# Altium footprint library CONN_B2B.PcbLib: 30 footprints (part 2 of 2)
Each footprint in its own frame and in the unit in brackets; x right, y up, seen from the top. Pads: shape width x height; smd on the part's side, far side on the other; paste and mask are expansions set on the pad; w line width, h text height; cw(c..) or ccw(c..) is an arc to the next point about the centre after c.
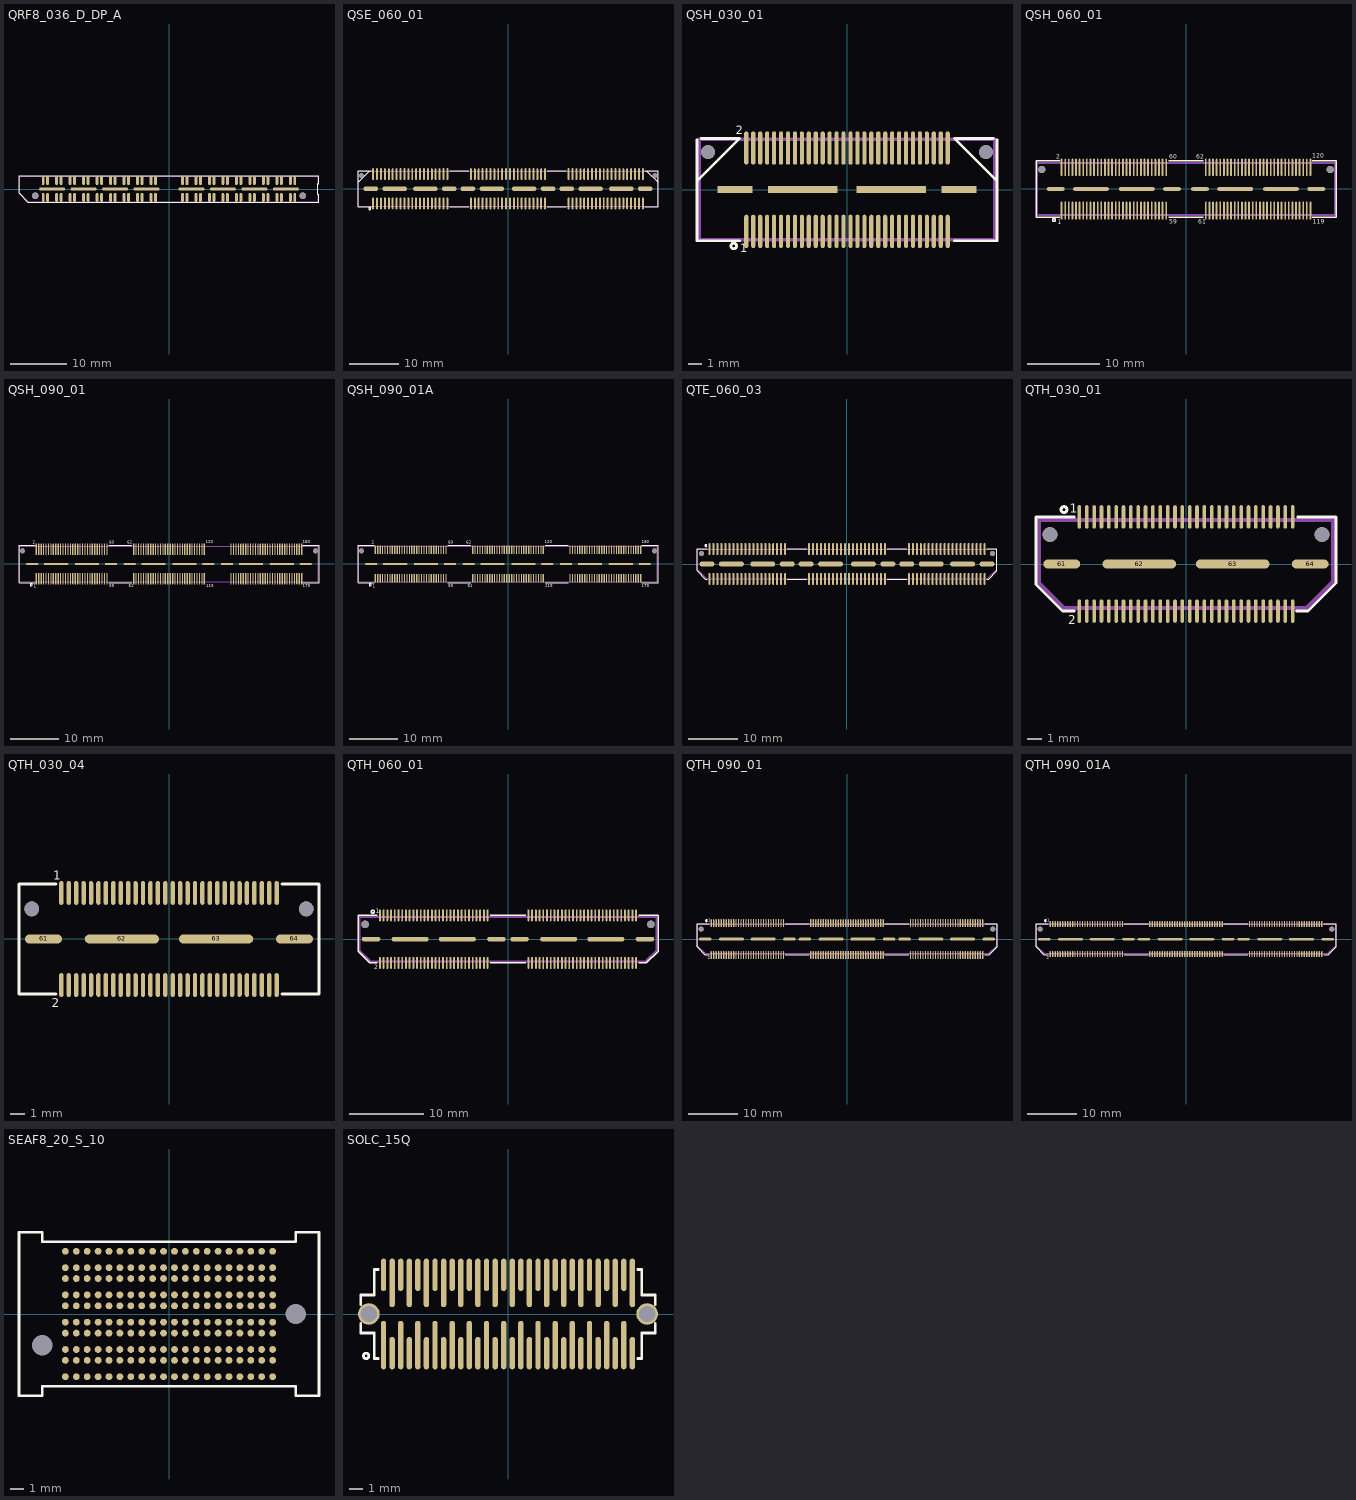
[diagram p1: the footprints below, top view; thin cyan lines are the x and y axes]

## QRF8_036_D_DP_A [mm] "Samtec, QRF8-036-D-DP-A, 0.80 mm Q Rate® High-Speed Ground Plane Slim Body Socket Strip, Differential Pair"
pads (82):
  oval 0.5x1.6 smd mask+0.05: 1(-22.4,-1.5) 2(-22.4,1.5) 3(-21.6,-1.5) 4(-21.6,1.5) 5(-20,-1.5) 6(-20,1.5) 7(-19.2,-1.5) 8(-19.2,1.5) 9(-17.6,-1.5) 10(-17.6,1.5) 11(-16.8,-1.5) 12(-16.8,1.5) 13(-15.2,-1.5) 14(-15.2,1.5) 15(-14.4,-1.5) 16(-14.4,1.5) 17(-12.8,-1.5) 18(-12.8,1.5) 19(-12,-1.5) 20(-12,1.5) 21(-10.4,-1.5) 22(-10.4,1.5) 23(-9.6,-1.5) 24(-9.6,1.5) 25(-8,-1.5) 26(-8,1.5) 27(-7.2,-1.5) 28(-7.2,1.5) 29(-5.6,-1.5) 30(-5.6,1.5) 31(-4.8,-1.5) 32(-4.8,1.5) 33(-3.2,-1.5) 34(-3.2,1.5) 35(-2.4,-1.5) 36(-2.4,1.5) 37(2.4,-1.5) 38(2.4,1.5) 39(3.2,-1.5) 40(3.2,1.5) 41(4.8,-1.5) 42(4.8,1.5) 43(5.6,-1.5) 44(5.6,1.5) 45(7.2,-1.5) 46(7.2,1.5) 47(8,-1.5) 48(8,1.5) 49(9.6,-1.5) 50(9.6,1.5) 51(10.4,-1.5) 52(10.4,1.5) 53(12,-1.5) 54(12,1.5) 55(12.8,-1.5) 56(12.8,1.5) 57(14.4,-1.5) 58(14.4,1.5) 59(15.2,-1.5) 60(15.2,1.5) 61(16.8,-1.5) 62(16.8,1.5) 63(17.6,-1.5) 64(17.6,1.5) 65(19.2,-1.5) 66(19.2,1.5) 67(20,-1.5) 68(20,1.5) 69(21.6,-1.5) 70(21.6,1.5) 71(22.4,-1.5) 72(22.4,1.5)
  oval 4.6x0.6 smd mask+0.05: G1(-20.8,0) G2(-15.2,0) G3(-9.6,0) G4(-4,0) G5(4,0) G6(9.6,0) G7(15.2,0) G8(20.8,0)
  round 1.2 hole 1.2 unplated mask+0.1: ""(-23.8,-1.2) ""(23.8,-1.2)
Top Overlay:
  lines w0.2: -26.7,-0.8 -26.7,2.4 26.7,2.4 26.7,0.9 26.5,0.9 26.5,-0.9 26.7,-0.9 26.7,-2.4 -25.1,-2.4 -26.7,-0.8
Mechanical 13:
  lines w0.1: -26.585,-0.8 -26.585,2.3 26.585,2.3 26.585,1 26.485,1 26.485,-1 26.585,-1 26.585,-2.3 -25.085,-2.3 -26.585,-0.8
3D body "QRF8-036-05.0-L-D-DP-A.stp": height 6.26, standoff -1.28, extent -26.585,-2.3 26.585,2.3

## QSE_060_01 [mm] "samtec 0.80 mm Q Strip® High Speed Ground Plane Socket Strip"
pads (134):
  oval 0.4x2.4 smd: 1(-27.6,-3) 2(-27.6,3) 3(-26.8,-3) 4(-26.8,3) 5(-26,-3) 6(-26,3) 7(-25.2,-3) 8(-25.2,3) 9(-24.4,-3) 10(-24.4,3) 11(-23.6,-3) 12(-23.6,3) 13(-22.8,-3) 14(-22.8,3) 15(-22,-3) 16(-22,3) 17(-21.2,-3) 18(-21.2,3) 19(-20.4,-3) 20(-20.4,3) 21(-19.6,-3) 22(-19.6,3) 23(-18.8,-3) 24(-18.8,3) 25(-18,-3) 26(-18,3) 27(-17.2,-3) 28(-17.2,3) 29(-16.4,-3) 30(-16.4,3) 31(-15.6,-3) 32(-15.6,3) 33(-14.8,-3) 34(-14.8,3) 35(-14,-3) 36(-14,3) 37(-13.2,-3) 38(-13.2,3) 39(-12.4,-3) 40(-12.4,3) 41(-7.6,-3) 42(-7.6,3) 43(-6.8,-3) 44(-6.8,3) 45(-6,-3) 46(-6,3) 47(-5.2,-3) 48(-5.2,3) 49(-4.4,-3) 50(-4.4,3) 51(-3.6,-3) 52(-3.6,3) 53(-2.8,-3) 54(-2.8,3) 55(-2,-3) 56(-2,3) 57(-1.2,-3) 58(-1.2,3) 59(-0.4,-3) 60(-0.4,3) 61(0.4,-3) 62(0.4,3) 63(1.2,-3) 64(1.2,3) 65(2,-3) 66(2,3) 67(2.8,-3) 68(2.8,3) 69(3.6,-3) 70(3.6,3) 71(4.4,-3) 72(4.4,3) 73(5.2,-3) 74(5.2,3) 75(6,-3) 76(6,3) 77(6.8,-3) 78(6.8,3) 79(7.6,-3) 80(7.6,3) 81(12.4,-3) 82(12.4,3) 83(13.2,-3) 84(13.2,3) 85(14,-3) 86(14,3) 87(14.8,-3) 88(14.8,3) 89(15.6,-3) 90(15.6,3) 91(16.4,-3) 92(16.4,3) 93(17.2,-3) 94(17.2,3) 95(18,-3) 96(18,3) 97(18.8,-3) 98(18.8,3) 99(19.6,-3) 100(19.6,3) 101(20.4,-3) 102(20.4,3) 103(21.2,-3) 104(21.2,3) 105(22,-3) 106(22,3) 107(22.8,-3) 108(22.8,3) 109(23.6,-3) 110(23.6,3) 111(24.4,-3) 112(24.4,3) 113(25.2,-3) 114(25.2,3) 115(26,-3) 116(26,3) 117(26.8,-3) 118(26.8,3) 119(27.6,-3) 120(27.6,3)
  oval 3x1 smd mask+0.1: 121(-28.1,0) 124(-12,0) 125(-8.2,0) 128(8.2,0) 129(12,0) 132(28.1,0)
  oval 5x1 smd mask+0.1: 122(-23.2,0) 123(-16.9,0) 126(-3.3,0) 127(3.3,0) 130(16.9,0) 131(23.2,0)
  round 1 hole 1 unplated: ""(-30,2.7) ""(30.1,2.7)
Top Overlay:
  circle w0.2: c-28.3,-4.1 r0.2
  lines w0.2: -30.7,1.3 -28.3,3.7 ; -28,-3.7 -30.7,-3.7 -30.7,3.7 -28,3.7 ; -11.95,-3.7 -8.05,-3.7 ; -11.95,3.7 -8.05,3.7 ; 8.05,-3.7 11.95,-3.7 ; 8.05,3.7 11.95,3.7 ; 27.95,-3.7 30.7,-3.7 30.7,3.7 28,3.7 ; 28.3,3.7 30.7,1.3
Mechanical 13:
  lines w0.1: -30.6,-3.6 30.6,-3.6 30.6,3.6 -30.6,3.6 -30.6,-3.6
3D body "Samtec-QSE-060-01-L-D-A.step": height 3.25, standoff -0.75, extent -30.6,-3.7 30.677,3.793

## QSH_030_01 [mm] "samtec 0.50mm Q Strip® High Speed Ground Plane Socket Strip"
height 1.2
pads (66):
  oval 0.3x2.4 smd paste-0.05 mask+0.05: 1(-7.25,-3) 2(-7.25,3) 3(-6.75,-3) 4(-6.75,3) 5(-6.25,-3) 6(-6.25,3) 7(-5.75,-3) 8(-5.75,3) 9(-5.25,-3) 10(-5.25,3) 11(-4.75,-3) 12(-4.75,3) 13(-4.25,-3) 14(-4.25,3) 15(-3.75,-3) 16(-3.75,3) 17(-3.25,-3) 18(-3.25,3) 19(-2.75,-3) 20(-2.75,3) 21(-2.25,-3) 22(-2.25,3) 23(-1.75,-3) 24(-1.75,3) 25(-1.25,-3) 26(-1.25,3) 27(-0.75,-3) 28(-0.75,3) 29(-0.25,-3) 30(-0.25,3) 31(0.25,-3) 32(0.25,3) 33(0.75,-3) 34(0.75,3) 35(1.25,-3) 36(1.25,3) 37(1.75,-3) 38(1.75,3) 39(2.25,-3) 40(2.25,3) 41(2.75,-3) 42(2.75,3) 43(3.25,-3) 44(3.25,3) 45(3.75,-3) 46(3.75,3) 47(4.25,-3) 48(4.25,3) 49(4.75,-3) 50(4.75,3) 51(5.25,-3) 52(5.25,3) 53(5.75,-3) 54(5.75,3) 55(6.25,-3) 56(6.25,3) 57(6.75,-3) 58(6.75,3) 59(7.25,-3) 60(7.25,3)
  rect 2.5x0.5 smd mask+0.1: 61(-8.065,0) 64(8.065,0)
  rect 5x0.5 smd mask+0.1: 62(-3.175,0) 63(3.175,0)
  round 1 hole 1 unplated: ""(-10,2.7) ""(10,2.7)
Top Overlay:
  circle w0.2: c-8.15,-4.05 r0.2
  lines w0.2: -10.8,0 -10.8,0.63 -7.747,3.683 -10.5,3.683 ; -10.8,3.6 -10.8,-3.683 -7.747,-3.683 ; 7.747,-3.683 10.8,-3.683 10.8,3.6 ; 10.541,3.683 7.747,3.683 10.8,0.63 10.8,0
  text "1" at -7.7,-4.5 h0.6
  text "2" at -8,4 h0.6
Mechanical 15:
  lines w0.254: -10.655,-3.62 -10.655,3.62 10.655,3.62 10.655,-3.62 -10.655,-3.62
3D body "QSH-030-01-L-D-A.stp": height 3.25, standoff -0.31, extent -10.65,-3.75 10.661,3.744

## QSH_060_01 [mm] "samtec 0.50mm Q Strip® High Speed Ground Plane Socket Strip, QSH-060-01-L-D-A"
pads (130):
  oval 0.25x2.5 smd mask+0.05: 1(-17.25,-3) 3(-16.75,-3) 5(-16.25,-3) 7(-15.75,-3) 9(-15.25,-3) 11(-14.75,-3) 13(-14.25,-3) 15(-13.75,-3) 17(-13.25,-3) 19(-12.75,-3) 21(-12.25,-3) 23(-11.75,-3) 25(-11.25,-3) 27(-10.75,-3) 29(-10.25,-3) 31(-9.75,-3) 33(-9.25,-3) 35(-8.75,-3) 37(-8.25,-3) 39(-7.75,-3) 41(-7.25,-3) 43(-6.75,-3) 45(-6.25,-3) 47(-5.75,-3) 49(-5.25,-3) 51(-4.75,-3) 53(-4.25,-3) 55(-3.75,-3) 57(-3.25,-3) 59(-2.75,-3) 61(2.75,-3) 63(3.25,-3) 65(3.75,-3) 67(4.25,-3) 69(4.75,-3) 71(5.25,-3) 73(5.75,-3) 75(6.25,-3) 77(6.75,-3) 79(7.25,-3) 81(7.75,-3) 83(8.25,-3) 85(8.75,-3) 87(9.25,-3) 89(9.75,-3) 91(10.25,-3) 93(10.75,-3) 95(11.25,-3) 97(11.75,-3) 99(12.25,-3) 101(12.75,-3) 103(13.25,-3) 105(13.75,-3) 107(14.25,-3) 109(14.75,-3) 111(15.25,-3) 113(15.75,-3) 115(16.25,-3) 117(16.75,-3) 119(17.25,-3)
  oval 0.25x2.4 smd mask+0.05: 2(-17.25,3) 4(-16.75,3) 6(-16.25,3) 8(-15.75,3) 10(-15.25,3) 12(-14.75,3) 14(-14.25,3) 16(-13.75,3) 18(-13.25,3) 20(-12.75,3) 22(-12.25,3) 24(-11.75,3) 26(-11.25,3) 28(-10.75,3) 30(-10.25,3) 32(-9.75,3) 34(-9.25,3) 36(-8.75,3) 38(-8.25,3) 40(-7.75,3) 42(-7.25,3) 44(-6.75,3) 46(-6.25,3) 48(-5.75,3) 50(-5.25,3) 52(-4.75,3) 54(-4.25,3) 56(-3.75,3) 58(-3.25,3) 60(-2.75,3) 62(2.75,3) 64(3.25,3) 66(3.75,3) 68(4.25,3) 70(4.75,3) 72(5.25,3) 74(5.75,3) 76(6.25,3) 78(6.75,3) 80(7.25,3) 82(7.75,3) 84(8.25,3) 86(8.75,3) 88(9.25,3) 90(9.75,3) 92(10.25,3) 94(10.75,3) 96(11.25,3) 98(11.75,3) 100(12.25,3) 102(12.75,3) 104(13.25,3) 106(13.75,3) 108(14.25,3) 110(14.75,3) 112(15.25,3) 114(15.75,3) 116(16.25,3) 118(16.75,3) 120(17.25,3)
  oval 2.5x0.5 smd mask+0.1: 121(-18.065,0) 124(-1.935,0) 125(1.935,0) 128(18.065,0)
  oval 5x0.5 smd mask+0.1: 122(-13.175,0) 123(-6.825,0) 126(6.825,0) 127(13.175,0)
  round 1 hole 1 unplated: ""(-20,2.7) ""(20,2.7)
Top Overlay:
  circle w0.2: c-18.3,-4.3 r0.2
  lines w0.2: -17.5,-3.9 -20.8,-3.9 -20.8,3.9 -17.5,3.9 ; -2.4,-3.9 2.4,-3.9 ; -2.4,3.9 2.4,3.9 ; 17.5,-3.9 20.8,-3.9 20.8,3.9 17.5,3.9
  text "120" at 17.5,4.3 h0.6
  text "119" at 17.6,-4.8 h0.6
  text "61" at 1.7,-4.8 h0.6
  text "62" at 1.4,4.2 h0.6
  text "59" at -2.3,-4.8 h0.6
  text "60" at -2.3,4.2 h0.6
  text "2" at -18,4.2 h0.6
  text "1" at -17.8,-4.9 h0.6
Mechanical 15:
  lines w0.254: -20.65,-3.62 20.65,-3.62 20.65,3.62 -20.65,3.62 -20.65,-3.62
3D body "Samtec-QSH-060-01-L-D-A.step": height 3.2, standoff -0.8, extent -20.677,-3.746 20.636,3.747

## QSH_090_01 [mm] "Speed Ground Plane Socket Strip, QSH-060-01-L-D-A"
pads (194):
  oval 0.25x2.4 smd mask+0.05: 1(-27.25,-3) 2(-27.25,3) 3(-26.75,-3) 4(-26.75,3) 5(-26.25,-3) 6(-26.25,3) 7(-25.75,-3) 8(-25.75,3) 9(-25.25,-3) 10(-25.25,3) 11(-24.75,-3) 12(-24.75,3) 13(-24.25,-3) 14(-24.25,3) 15(-23.75,-3) 16(-23.75,3) 17(-23.25,-3) 18(-23.25,3) 19(-22.75,-3) 20(-22.75,3) 21(-22.25,-3) 22(-22.25,3) 23(-21.75,-3) 24(-21.75,3) 25(-21.25,-3) 26(-21.25,3) 27(-20.75,-3) 28(-20.75,3) 29(-20.25,-3) 30(-20.25,3) 31(-19.75,-3) 32(-19.75,3) 33(-19.25,-3) 34(-19.25,3) 35(-18.75,-3) 36(-18.75,3) 37(-18.25,-3) 38(-18.25,3) 39(-17.75,-3) 40(-17.75,3) 41(-17.25,-3) 42(-17.25,3) 43(-16.75,-3) 44(-16.75,3) 45(-16.25,-3) 46(-16.25,3) 47(-15.75,-3) 48(-15.75,3) 49(-15.25,-3) 50(-15.25,3) 51(-14.75,-3) 52(-14.75,3) 53(-14.25,-3) 54(-14.25,3) 55(-13.75,-3) 56(-13.75,3) 57(-13.25,-3) 58(-13.25,3) 59(-12.75,-3) 60(-12.75,3) 61(-7.25,-3) 62(-7.25,3) 63(-6.75,-3) 64(-6.75,3) 65(-6.25,-3) 66(-6.25,3) 67(-5.75,-3) 68(-5.75,3) 69(-5.25,-3) 70(-5.25,3) 71(-4.75,-3) 72(-4.75,3) 73(-4.25,-3) 74(-4.25,3) 75(-3.75,-3) 76(-3.75,3) 77(-3.25,-3) 78(-3.25,3) 79(-2.75,-3) 80(-2.75,3) 81(-2.25,-3) 82(-2.25,3) 83(-1.75,-3) 84(-1.75,3) 85(-1.25,-3) 86(-1.25,3) 87(-0.75,-3) 88(-0.75,3) 89(-0.25,-3) 90(-0.25,3) 91(0.25,-3) 92(0.25,3) 93(0.75,-3) 94(0.75,3) 95(1.25,-3) 96(1.25,3) 97(1.75,-3) 98(1.75,3) 99(2.25,-3) 100(2.25,3) 101(2.75,-3) 102(2.75,3) 103(3.25,-3) 104(3.25,3) 105(3.75,-3) 106(3.75,3) 107(4.25,-3) 108(4.25,3) 109(4.75,-3) 110(4.75,3) 111(5.25,-3) 112(5.25,3) 113(5.75,-3) 114(5.75,3) 115(6.25,-3) 116(6.25,3) 117(6.75,-3) 118(6.75,3) 119(7.25,-3) 120(7.25,3) 121(12.75,-3) 122(12.75,3) 123(13.25,-3) 124(13.25,3) 125(13.75,-3) 126(13.75,3) 127(14.25,-3) 128(14.25,3) 129(14.75,-3) 130(14.75,3) 131(15.25,-3) 132(15.25,3) 133(15.75,-3) 134(15.75,3) 135(16.25,-3) 136(16.25,3) 137(16.75,-3) 138(16.75,3) 139(17.25,-3) 140(17.25,3) 141(17.75,-3) 142(17.75,3) 143(18.25,-3) 144(18.25,3) 145(18.75,-3) 146(18.75,3) 147(19.25,-3) 148(19.25,3) 149(19.75,-3) 150(19.75,3) 151(20.25,-3) 152(20.25,3) 153(20.75,-3) 154(20.75,3) 155(21.25,-3) 156(21.25,3) 157(21.75,-3) 158(21.75,3) 159(22.25,-3) 160(22.25,3) 161(22.75,-3) 162(22.75,3) 163(23.25,-3) 164(23.25,3) 165(23.75,-3) 166(23.75,3) 167(24.25,-3) 168(24.25,3) 169(24.75,-3) 170(24.75,3) 171(25.25,-3) 172(25.25,3) 173(25.75,-3) 174(25.75,3) 175(26.25,-3) 176(26.25,3) 177(26.75,-3) 178(26.75,3) 179(27.25,-3) 180(27.25,3)
  oval 2.5x0.5 smd mask+0.1: 181(-28.065,0) 184(-11.935,0) 185(-8.065,0) 188(8.065,0) 189(11.935,0) 192(28.065,0)
  oval 5x0.5 smd mask+0.1: 182(-23.175,0) 183(-16.825,0) 186(-3.175,0) 187(3.175,0) 190(16.825,0) 191(23.175,0)
  round 1 hole 1 unplated: ""(-30.1,2.7) ""(30.1,2.7)
Top Overlay:
  circle w0.2: c-28.3,-4.3 r0.2
  lines w0.2: -27.5,-3.9 -30.8,-3.9 -30.8,3.9 -27.5,3.9 ; -12.4,-3.9 -7.6,-3.9 ; -12.4,3.9 -7.6,3.9 ; 27.5,-3.9 30.8,-3.9 30.8,3.9 27.5,3.9
  text "120" at 7.5,4.3 h0.6
  text "119" at 7.6,-4.8 h0.6
  text "61" at -8.3,-4.8 h0.6
  text "62" at -8.6,4.2 h0.6
  text "59" at -12.3,-4.8 h0.6
  text "60" at -12.3,4.2 h0.6
  text "2" at -28,4.2 h0.6
  text "1" at -27.8,-4.9 h0.6
  text "180" at 27.5,4.3 h0.6
  text "179" at 27.5,-4.8 h0.6
Mechanical 15:
  lines w0.254: -30.65,-3.62 30.65,-3.62 30.65,3.62 -30.65,3.62 -30.65,-3.62
3D body "QSH-090-01-F-D-A.stp": height 3.25, standoff -0.75, extent -30.689,-3.747 30.69,3.747

## QSH_090_01A [mm] "Speed Ground Plane Socket Strip, QSH-060-01-L-D-A"
height 0.4
pads (194):
  oval 0.25x1.8 smd mask+0.05: 1(-27.25,-2.925) 2(-27.25,2.925) 3(-26.75,-2.925) 4(-26.75,2.925) 5(-26.25,-2.925) 6(-26.25,2.925) 7(-25.75,-2.925) 8(-25.75,2.925) 9(-25.25,-2.925) 10(-25.25,2.925) 11(-24.75,-2.925) 12(-24.75,2.925) 13(-24.25,-2.925) 14(-24.25,2.925) 15(-23.75,-2.925) 16(-23.75,2.925) 17(-23.25,-2.925) 18(-23.25,2.925) 19(-22.75,-2.925) 20(-22.75,2.925) 21(-22.25,-2.925) 22(-22.25,2.925) 23(-21.75,-2.925) 24(-21.75,2.925) 25(-21.25,-2.925) 26(-21.25,2.925) 27(-20.75,-2.925) 28(-20.75,2.925) 29(-20.25,-2.925) 30(-20.25,2.925) 31(-19.75,-2.925) 32(-19.75,2.925) 33(-19.25,-2.925) 34(-19.25,2.925) 35(-18.75,-2.925) 36(-18.75,2.925) 37(-18.25,-2.925) 38(-18.25,2.925) 39(-17.75,-2.925) 40(-17.75,2.925) 41(-17.25,-2.925) 42(-17.25,2.925) 43(-16.75,-2.925) 44(-16.75,2.925) 45(-16.25,-2.925) 46(-16.25,2.925) 47(-15.75,-2.925) 48(-15.75,2.925) 49(-15.25,-2.925) 50(-15.25,2.925) 51(-14.75,-2.925) 52(-14.75,2.925) 53(-14.25,-2.925) 54(-14.25,2.925) 55(-13.75,-2.925) 56(-13.75,2.925) 57(-13.25,-2.925) 58(-13.25,2.925) 59(-12.75,-2.925) 60(-12.75,2.925) 61(-7.25,-2.925) 62(-7.25,2.925) 63(-6.75,-2.925) 64(-6.75,2.925) 65(-6.25,-2.925) 66(-6.25,2.925) 67(-5.75,-2.925) 68(-5.75,2.925) 69(-5.25,-2.925) 70(-5.25,2.925) 71(-4.75,-2.925) 72(-4.75,2.925) 73(-4.25,-2.925) 74(-4.25,2.925) 75(-3.75,-2.925) 76(-3.75,2.925) 77(-3.25,-2.925) 78(-3.25,2.925) 79(-2.75,-2.925) 80(-2.75,2.925) 81(-2.25,-2.925) 82(-2.25,2.925) 83(-1.75,-2.925) 84(-1.75,2.925) 85(-1.25,-2.925) 86(-1.25,2.925) 87(-0.75,-2.925) 88(-0.75,2.925) 89(-0.25,-2.925) 90(-0.25,2.925) 91(0.25,-2.925) 92(0.25,2.925) 93(0.75,-2.925) 94(0.75,2.925) 95(1.25,-2.925) 96(1.25,2.925) 97(1.75,-2.925) 98(1.75,2.925) 99(2.25,-2.925) 100(2.25,2.925) 101(2.75,-2.925) 102(2.75,2.925) 103(3.25,-2.925) 104(3.25,2.925) 105(3.75,-2.925) 106(3.75,2.925) 107(4.25,-2.925) 108(4.25,2.925) 109(4.75,-2.925) 110(4.75,2.925) 111(5.25,-2.925) 112(5.25,2.925) 113(5.75,-2.925) 114(5.75,2.925) 115(6.25,-2.925) 116(6.25,2.925) 117(6.75,-2.925) 118(6.75,2.925) 119(7.25,-2.925) 120(7.25,2.925) 121(12.75,-2.925) 122(12.75,2.925) 123(13.25,-2.925) 124(13.25,2.925) 125(13.75,-2.925) 126(13.75,2.925) 127(14.25,-2.925) 128(14.25,2.925) 129(14.75,-2.925) 130(14.75,2.925) 131(15.25,-2.925) 132(15.25,2.925) 133(15.75,-2.925) 134(15.75,2.925) 135(16.25,-2.925) 136(16.25,2.925) 137(16.75,-2.925) 138(16.75,2.925) 139(17.25,-2.925) 140(17.25,2.925) 141(17.75,-2.925) 142(17.75,2.925) 143(18.25,-2.925) 144(18.25,2.925) 145(18.75,-2.925) 146(18.75,2.925) 147(19.25,-2.925) 148(19.25,2.925) 149(19.75,-2.925) 150(19.75,2.925) 151(20.25,-2.925) 152(20.25,2.925) 153(20.75,-2.925) 154(20.75,2.925) 155(21.25,-2.925) 156(21.25,2.925) 157(21.75,-2.925) 158(21.75,2.925) 159(22.25,-2.925) 160(22.25,2.925) 161(22.75,-2.925) 162(22.75,2.925) 163(23.25,-2.925) 164(23.25,2.925) 165(23.75,-2.925) 166(23.75,2.925) 167(24.25,-2.925) 168(24.25,2.925) 169(24.75,-2.925) 170(24.75,2.925) 171(25.25,-2.925) 172(25.25,2.925) 173(25.75,-2.925) 174(25.75,2.925) 175(26.25,-2.925) 176(26.25,2.925) 177(26.75,-2.925) 178(26.75,2.925) 179(27.25,-2.925) 180(27.25,2.925)
  oval 2.5x0.5 smd mask+0.1: 181(-28.065,0) 184(-11.935,0) 185(-8.065,0) 188(8.065,0) 189(11.935,0) 192(28.065,0)
  oval 5x0.5 smd mask+0.1: 182(-23.175,0) 183(-16.825,0) 186(-3.175,0) 187(3.175,0) 190(16.825,0) 191(23.175,0)
  round 1 hole 1 unplated: ""(-30.1,2.7) ""(30.1,2.7)
Top Overlay:
  circle w0.2: c-28.3,-4.3 r0.2
  lines w0.2: -27.5,-3.9 -30.8,-3.9 -30.8,3.9 -27.5,3.9 ; -12.4,-3.9 -7.6,-3.9 ; -12.4,3.9 -7.6,3.9 ; 7.6,-3.9 12.4,-3.9 ; 7.6,3.9 12.4,3.9 ; 27.5,-3.9 30.8,-3.9 30.8,3.9 27.5,3.9
  text "120" at 7.5,4.3 h0.6
  text "119" at 7.6,-4.8 h0.6
  text "61" at -8.3,-4.8 h0.6
  text "62" at -8.6,4.2 h0.6
  text "59" at -12.3,-4.8 h0.6
  text "60" at -12.3,4.2 h0.6
  text "2" at -28,4.2 h0.6
  text "1" at -27.8,-4.9 h0.6
  text "180" at 27.5,4.3 h0.6
  text "179" at 27.5,-4.8 h0.6
Mechanical 15:
  lines w0.254: -30.65,-3.62 30.65,-3.62 30.65,3.62 -30.65,3.62 -30.65,-3.62
3D body "QSH-090-01-F-D-A.stp": height 3.25, standoff -0.75, extent -30.689,-3.747 30.69,3.747
